# Altium footprint library PcbLib1.PcbLib: 9 footprints
Each footprint in its own frame and in the unit in brackets; x right, y up, seen from the top. Pads: shape width x height; smd on the part's side, far side on the other; paste and mask are expansions set on the pad; w line width, h text height; cw(c..) or ccw(c..) is an arc to the next point about the centre after c.
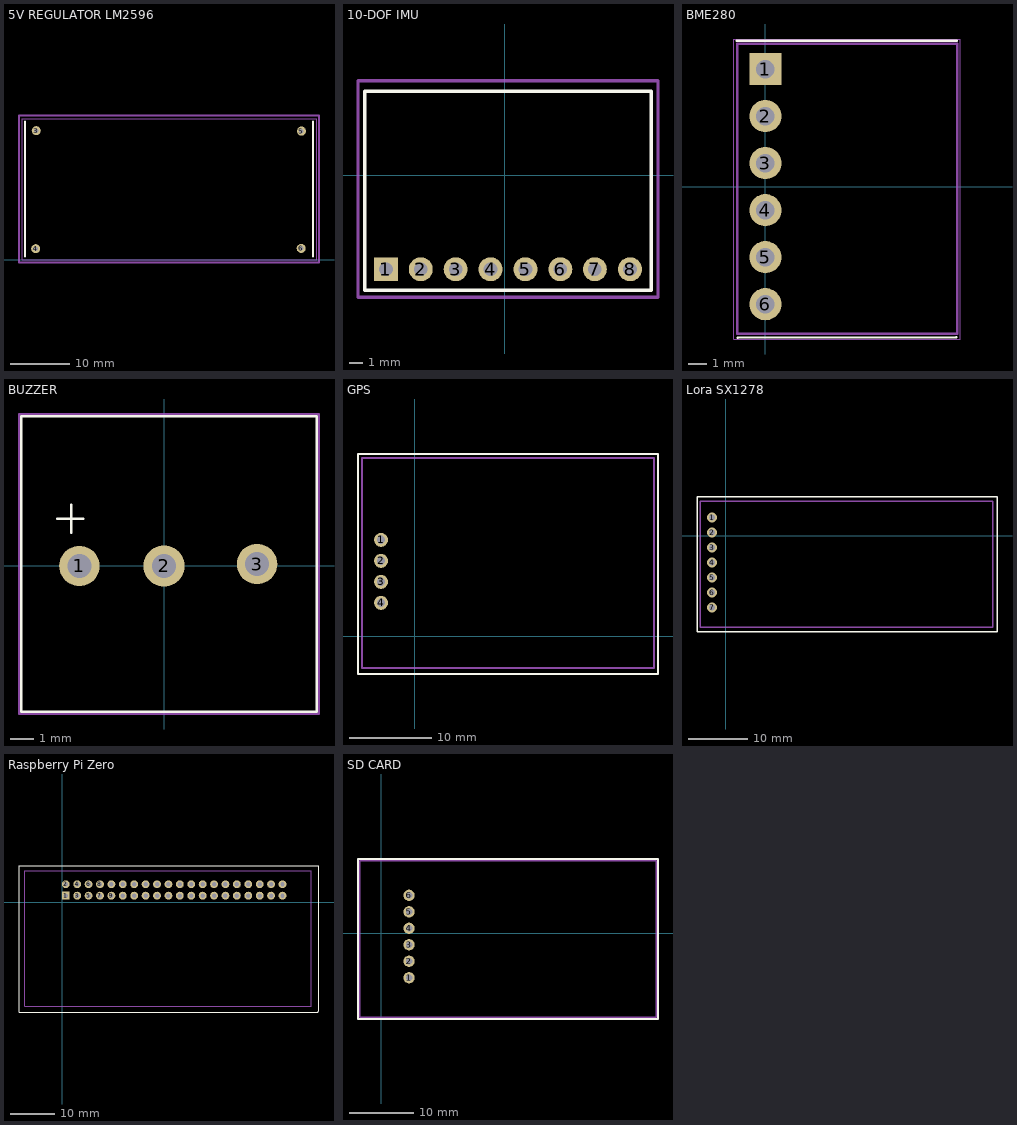
[diagram p0: the footprints below, top view; thin cyan lines are the x and y axes]

## 5V REGULATOR LM2596 [mil]
pads (4):
  round 60 hole 30: 3(635,859) 4(631,72) 5(2403,856) 6(2401,74)
Top Overlay:
  lines w15: 560,20 560,920 ; 2480,20 2480,920
Mechanical 1:
  lines w5: 540,0 540,940 2504,940 2504,0 540,0
Mechanical 15:
  lines w15.75: 520,-20 2520,-20 2520,960 520,960 520,-20
3D body "User Library-LM2596_DC-DC_CONVERTER.STEP": height 465.31, standoff -78.4, extent 574.04,13.48 2463.8,919

## 10-DOF IMU [mm]
pads (8):
  rect 1.74x1.74 hole 1: 1(-8.636,-6.858)
  round 1.74 hole 1: 2(-6.096,-6.858) 3(-3.556,-6.858) 4(-1.016,-6.858) 5(1.524,-6.858) 6(4.064,-6.858) 7(6.579,-6.858) 8(9.144,-6.858)
Top Overlay:
  lines w0.254: -10.16,-8.382 -10.16,6.096 10.668,6.096 10.668,-8.382 -10.16,-8.382
Mechanical 1:
  lines w0.254: -10.668,-8.89 -10.668,6.35 -10.668,6.858 11.176,6.858 11.176,-8.89 -10.668,-8.89
3D body "GY-91_MPU9250+BMP280 - Pins Up.STEP": height 6.35, standoff -6.34, extent -9.906,-8.128 10.414,5.772

## BME280 [mm]
pads (6):
  rect 1.74x1.74 hole 1: 1(0,6.35)
  round 1.74 hole 1: 2(0,3.81) 3(0,1.27) 4(0,-1.27) 5(0,-3.81) 6(0,-6.35)
Top Overlay:
  lines w0.127: -1.549,7.874 10.338,7.874 ; -1.503,-8.153 10.312,-8.128
Mechanical 13:
  lines w0.127: -1.524,-7.95 10.363,-7.95 10.363,7.722 -1.524,7.722 -1.524,-7.95
Mechanical 15:
  lines w0.05: -1.701,-8.23 -1.701,7.976 10.516,7.976 10.516,-8.23 -1.701,-8.23
3D body "User Library-Module_bme280.STEP": height 5.85, standoff -5.35, extent -1.295,-7.772 10.205,7.568

## BUZZER [mm]
pads (3):
  round 1.7 hole 1: 1(-3.556,0) 3(3.909,0.084)
  round 1.74 hole 1: 2(0,0)
Top Overlay:
  lines w0.1: -3.991,1.984 -4.491,1.984 -3.391,1.984 ; -3.891,1.384 -3.891,2.584 ; -5.991,-6.116 6.409,-6.116 6.409,6.284 -5.991,6.284 -5.991,-6.116
Mechanical 3:
  lines w0.1: -6.091,-6.216 6.509,-6.216 6.509,6.384 -6.091,6.384 -6.091,-6.216
3D body "cem-1205c.stp": height 9.5, standoff -4.5, extent -5.771,-6.006 6.229,5.994

## GPS [mm]
pads (4):
  round 1.7 hole 1 square: 1(-4.064,11.684)
  round 1.7 hole 1: 2(-4.064,9.144) 3(-4.064,6.604) 4(-4.064,4.064)
Top Overlay:
  lines w0.254: -6.858,-4.572 -6.858,22.098 29.464,22.098 29.464,-4.572 -6.858,-4.572
Mechanical 1:
  lines w0.254: -6.35,-3.81 -6.35,21.59 28.956,21.59 28.956,-3.81 -6.35,-3.81
3D body "GY-GPS6MV2 v1.STEP": height 8.29, standoff -1.71, extent -5.842,-4.972 29.558,21.228

## Lora SX1278 [mm]
pads (7):
  round 1.7 hole 1 square: 1(-2.286,3.048)
  round 1.7 hole 1: 2(-2.286,0.508) 3(-2.286,-2.032) 4(-2.286,-4.572) 5(-2.286,-7.112) 6(-2.286,-9.652) 7(-2.286,-12.192)
Top Overlay:
  lines w0.254: -4.826,-16.256 -4.826,6.604 45.974,6.604 45.974,6.35 45.974,-16.256 -4.826,-16.256
Mechanical 1:
  lines w0.254: -2,-15.494 45.212,-15.494 45.212,5.842 -2,5.842 -4.318,5.842 -4.318,-15.494 -1.778,-15.494
3D body "E32-433T20DT.stp": height 8.67, standoff -4.95, extent -3.864,-15.087 44.636,5.913

## Raspberry Pi Zero [mm]
pads (40):
  rect 1.74x1.74 hole 1 square: 1(0.762,1.524)
  round 1.74 hole 1: 2(0.762,4.064) 3(3.302,1.524) 4(3.302,4.064) 5(5.842,1.524) 6(5.842,4.064) 7(8.382,1.524) 8(8.382,4.064) 9(10.922,1.524) 10(10.922,4.064) 11(13.462,1.524) 12(13.462,4.064) 13(16.002,1.524) 14(16.002,4.064) 15(18.542,1.524) 16(18.542,4.064) 17(21.082,1.524) 18(21.082,4.064) 19(23.622,1.524) 20(23.622,4.064) 21(26.162,1.524) 22(26.162,4.064) 23(28.702,1.524) 24(28.702,4.064) 25(31.242,1.524) 26(31.242,4.064) 27(33.782,1.524) 28(33.782,4.064) 29(36.322,1.524) 30(36.322,4.064) 31(38.862,1.524) 32(38.862,4.064) 33(41.402,1.524) 34(41.402,4.064) 35(43.942,1.524) 36(43.942,4.064) 37(46.482,1.524) 38(46.482,4.064) 39(49.022,1.524) 40(49.022,4.064)
Top Overlay:
  lines w0.254: -9.652,7.366 -9.652,8.128 57.15,8.128 57.15,-24.13 56.896,-24.384 -9.652,-24.384 -9.652,7.62
Mechanical 1:
  lines w0.254: -8.382,-23.114 -8.382,7.112 55.372,7.112 55.372,6.604 55.372,-23.114 -8.382,-23.114
3D body "User Library-Raspberry_Pi_Zero (1).step": height 3.34, standoff -1.11, extent -7.608,-24.88 57.392,6.35

## Regulatör [mil]

## SD CARD [mm]
pads (6):
  round 1.74 hole 1.01 square: 1(4.318,-6.858) 6(4.318,5.842)
  round 1.74 hole 1.01: 2(4.318,-4.318) 3(4.318,-1.778) 4(4.318,0.762) 5(4.318,3.302)
Top Overlay:
  lines w0.254: -3.302,11.43 -3.556,11.43 ; -3.556,11.43 -3.556,-13.208 42.672,-13.208 42.672,11.43 -3.556,11.43
Mechanical 1:
  lines w0.254: -3.302,-12.954 42.418,-12.954 42.418,11.176 -3.302,11.176 -3.302,-12.954
3D body "Product_TF Micro SD Card Memory Modul Arduino.stp": height 5.59, standoff -1.71, extent -2.794,-12.508 42.936,11.492